# Altium footprint library Controller 1.4.PcbLib: 48 footprints (part 1 of 3)
Each footprint in its own frame and in the unit in brackets; x right, y up, seen from the top. Pads: shape width x height; smd on the part's side, far side on the other; paste and mask are expansions set on the pad; w line width, h text height; cw(c..) or ccw(c..) is an arc to the next point about the centre after c.
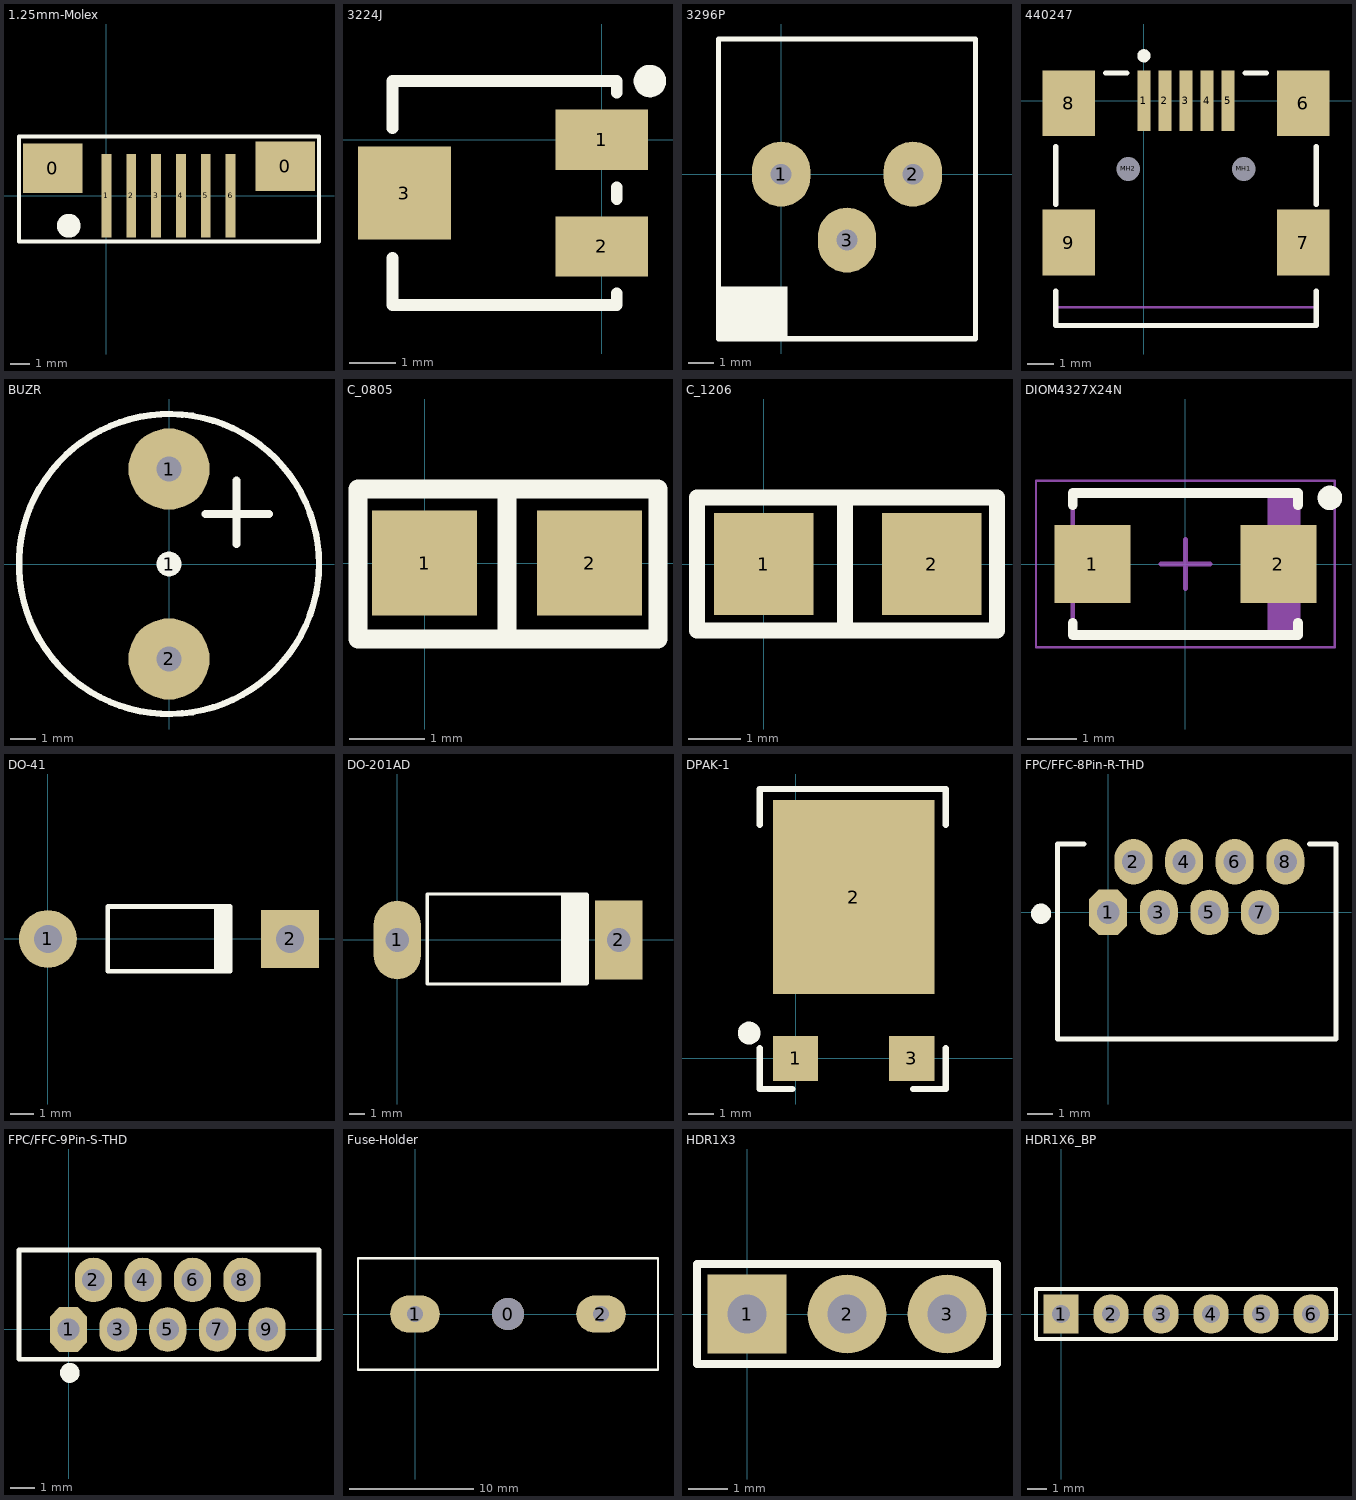
[diagram p0: the footprints below, top view; thin cyan lines are the x and y axes]

## 1.25mm-Molex [mm]
pads (8):
  rect 3x2.5 smd: 0(-2.7,1.4) 0(9,1.5)
  rect 0.5x4.2 smd: 1(0,0) 2(1.25,0) 3(2.5,0) 4(3.75,0) 5(5,0) 6(6.25,0)
Top Overlay:
  circle w0.6: c-1.9,-1.5 r0.3
  lines w0.2: -4.4,-2.3 -4.4,3 10.7,3 10.7,-2.3 -4.4,-2.3
3D body: height 4.7, standoff 0, extent -3.2,-1.6 9.45,2.6

## 3224J [mm]
pads (3):
  rect 2x1.3 smd: 1(0,0) 2(0,-2.3)
  rect 2x2 smd: 3(-4.25,-1.15)
Top Overlay:
  circle w0.35: c1.036,1.263 r0.175
  lines w0.254: -4.504,-2.547 -4.504,-3.563 0.322,-3.563 0.322,-3.309 ; -4.504,0.247 -4.504,1.263 0.322,1.263 0.322,1.009 ; 0.322,-1.277 0.322,-1.023
3D body: height 3.71, standoff 0, extent -4.591,-3.563 0.409,1.237

## 3296P [mm]
pads (3):
  oval 2.25x2.5 hole 0.8: 1(0,0) 2(5.08,0) 3(2.54,-2.54)
Top Overlay:
  rectangle: -2.413,-6.35 0.254,-4.318
  lines w0.2: -2.413,-6.343 -2.413,5.207 7.493,5.207 7.493,-6.343 -2.413,-6.343
3D body: height 4.9, standoff -2, extent -2.225,-6.343 7.305,5.207

## 440247 [mm]
pads (11):
  rect 0.5x2.3 smd: 1(0,0) 2(0.8,0) 3(1.6,0) 4(2.4,0) 5(3.2,0)
  rect 2x2.5 smd: 6(6.05,-0.1) 7(6.05,-5.4) 8(-2.85,-0.1) 9(-2.85,-5.4)
  round 0.6 hole 0.9 unplated: MH1(3.8,-2.6) MH2(-0.6,-2.6)
Top Overlay:
  circle w0.25: c0,1.7 r0.125
  lines w0.2: -3.35,-7.25 -3.35,-8.55 6.55,-8.55 6.55,-7.25 ; -3.35,-3.95 -3.35,-1.75 ; -1.45,1.05 -0.65,1.05 ; 3.85,1.05 4.65,1.05 ; 6.55,-3.95 6.55,-1.75
Mechanical 1:
  lines w0.1: -3.35,-7.85 6.55,-7.85
  text "PCB Edge" at -2.436,-8.282 h0.25
3D body: height 3.93, standoff -1, extent -3.4,-8.525 6.5,0.725

## BUZR [mm]
height 2.65
pads (3):
  round 1 on Top Overlay: 1(0,0)
  round 3.25 hole 1: 1(0,3.8) 2(0,-3.8)
Top Overlay:
  circle w0.254: c0,0 r6
  lines w0.305: 1.46,2 4,2 ; 2.7,0.8 2.7,3.34
3D body: height 9.65, standoff -4.5, extent -6,-5.927 6,9.527

## C_0805 [mm]
pads (2):
  rect 1.4x1.4 smd: 1(0,0) 2(2.2,0)
Top Overlay:
  lines w0.254: 1.1,-1.011 1.1,0.989 ; -0.889,-1.011 -0.889,-0.789 -0.889,0.989 0.635,0.989 1.587,0.989 3.111,0.989 3.111,-0.789 3.111,-1.011 1.587,-1.011 0.635,-1.011 -0.889,-1.011
3D body: height 0.78, standoff 0, extent 0.084,-0.625 2.084,0.625

## C_1206 [mm]
pads (2):
  rect 1.9x1.95 smd: 1(0,0) 2(3.2,0)
Top Overlay:
  lines w0.305: 1.551,-1.27 1.551,1.27 ; -1.27,-1.27 -1.27,1.27 0.535,1.27 4.445,1.27 4.445,-1.27 0.535,-1.27 -1.27,-1.27
3D body: height 1, standoff 0, extent 0,-0.8 3.2,0.8

## DIOM4327X24N [mm] "Molded Diode, 2-Leads, Body 4.29x2.69mm, IPC Medium Density"
height 2.44
pads (2):
  rect 1.55x1.6 smd: 1(-1.9,0) 2(1.9,0)
Top Overlay:
  circle w0.25: c2.95,1.35 r0.125
  lines w0.2: -2.3,-1.2 -2.3,-1.45 2.3,-1.45 2.3,-1.2 ; -2.3,1.2 -2.3,1.45 2.3,1.45 2.3,1.2
Mechanical 13:
  rectangle: 1.681,-1.45 2.3,1.45
  lines w0.1: -2.3,-1.45 -2.3,1.45 2.3,1.45 2.3,-1.45 -2.3,-1.45
Mechanical 15:
  lines w0.05: -3.05,-1.7 -3.05,1.7 3.05,1.7 3.05,-1.7 -3.05,-1.7
  lines w0.1: -0.5,0 0.5,0 ; 0,-0.5 0,0.5
3D body: height 2.44, standoff 0, extent -2.3,-1.45 2.3,1.45

## DO-41 [mm]
height 2.8
pads (2):
  round 2.5 hole 1.2: 1(0,0)
  rect 2.5x2.5 hole 1.2: 2(10.46,0)
Top Overlay:
  rectangle: 7.178,-1.403 7.978,1.397
  lines w0.2: 7.88,-1.4 2.58,-1.4 2.58,1.4 7.88,1.4
3D body: height 2.72, standoff -2.6, extent -0.305,-1.397 10.719,1.323

## DO-201AD [mm]
pads (2):
  oval 3x5 hole 1.5: 1(0,0)
  rect 3x5 hole 1.5: 2(14.097,0)
Top Overlay:
  rectangle: 10.414,-2.794 12.192,2.921
  lines w0.2: 12.065,-2.794 1.905,-2.794 1.905,2.921 12.065,2.921
3D body: height 5.8, standoff -3.3, extent -0.533,-2.794 14.757,2.816

## DPAK-1 [mil]
pads (3):
  rect 70x70 smd: 1(0,0) 3(180,0)
  rect 250x300 smd: 2(90,250)
Top Overlay:
  circle w17.72: c-71.8,39.37 r8.8
  lines w10: -55.12,-47.24 -5.12,-47.24 ; -55.12,-46.75 -55.12,15.75 ; -55.12,362.2 -55.12,417.32 232.28,417.32 232.28,362.2 ; 182.28,-47.24 232.28,-47.24 232.28,15.75
3D body: height 94.19, standoff -0.89, extent -40.95,-10.6 216.54,380.68

## FPC/FFC-8Pin-R-THD [mm] "1mm pich FPC Connector Right Angle"
pads (8):
  oct 1.5x1.8 hole 0.9: 1(0,0)
  oval 1.5x1.8 hole 0.9: 2(1,2) 3(2,0) 4(3,2) 5(4,0) 6(5,2) 7(6,0) 8(7,2)
Top Overlay:
  circle w0.4: c-2.65,-0.05 r0.2
  lines w0.2: -0.95,2.7 -2,2.7 -2,-5 9,-5 9,2.7 7.95,2.7
3D body: height 2.6, standoff -3.01, extent -2,-4.75 9,2.218

## FPC/FFC-9Pin-S-THD [mm]
pads (9):
  oct 1.5x1.8 hole 0.9: 1(0,0)
  oval 1.5x1.8 hole 0.9: 2(1,2) 3(2,0) 4(3,2) 5(4,0) 6(5,2) 7(6,0) 8(7,2) 9(8,0)
Top Overlay:
  circle w0.4: c0.05,-1.75 r0.2
  lines w0.2: -2,-1.2 10.1,-1.2 10.1,3.2 -2,3.2 -2,-1.2
3D body: height 5.5, standoff -3.01, extent -2,-0.35 10,2.25

## Fuse-Holder [mm]
pads (3):
  round 2.6 hole 2.6 unplated: 0(7.5,0)
  oval 4x3 hole 1.3: 1(0,0) 2(15,0)
Top Overlay:
  lines w0.2: -4.6,-4.5 -4.6,4.517 19.6,4.517 19.6,-4.5 -4.6,-4.5
3D body: height 13.46, standoff -2.4, extent -4.5,-4.482 19.5,4.6

## HDR1X3 [mm] "Connector; Header; 3 Position"
height 2.65
pads (3):
  rect 2x2 hole 1: 1(0,0)
  round 2 hole 1: 2(2.54,0) 3(5.08,0)
Top Overlay:
  lines w0.2: -1.27,-1.27 -1.27,1.27 6.35,1.27 6.35,-1.27 -1.27,-1.27
3D body: height 5.94, standoff -2.94, extent -1.31,-1.34 6.31,1.2

## HDR1X6_BP [mm] "Connector; Header; 6 Position"
pads (6):
  rect 1.8x2 hole 0.9: 1(0,0)
  oval 1.8x2 hole 0.9: 2(2.54,0) 3(5.08,0) 4(7.62,0) 5(10.16,0) 6(12.7,0)
Top Overlay:
  lines w0.2: -1.27,-1.27 -1.27,1.27 13.97,1.27 13.97,-1.27 -1.27,-1.27